# Altium footprint library LAN Transformer.PcbLib: 66 footprints (part 2 of 5)
Each footprint in its own frame and in the unit in brackets; x right, y up, seen from the top. Pads: shape width x height; smd on the part's side, far side on the other; paste and mask are expansions set on the pad; w line width, h text height; cw(c..) or ccw(c..) is an arc to the next point about the centre after c.
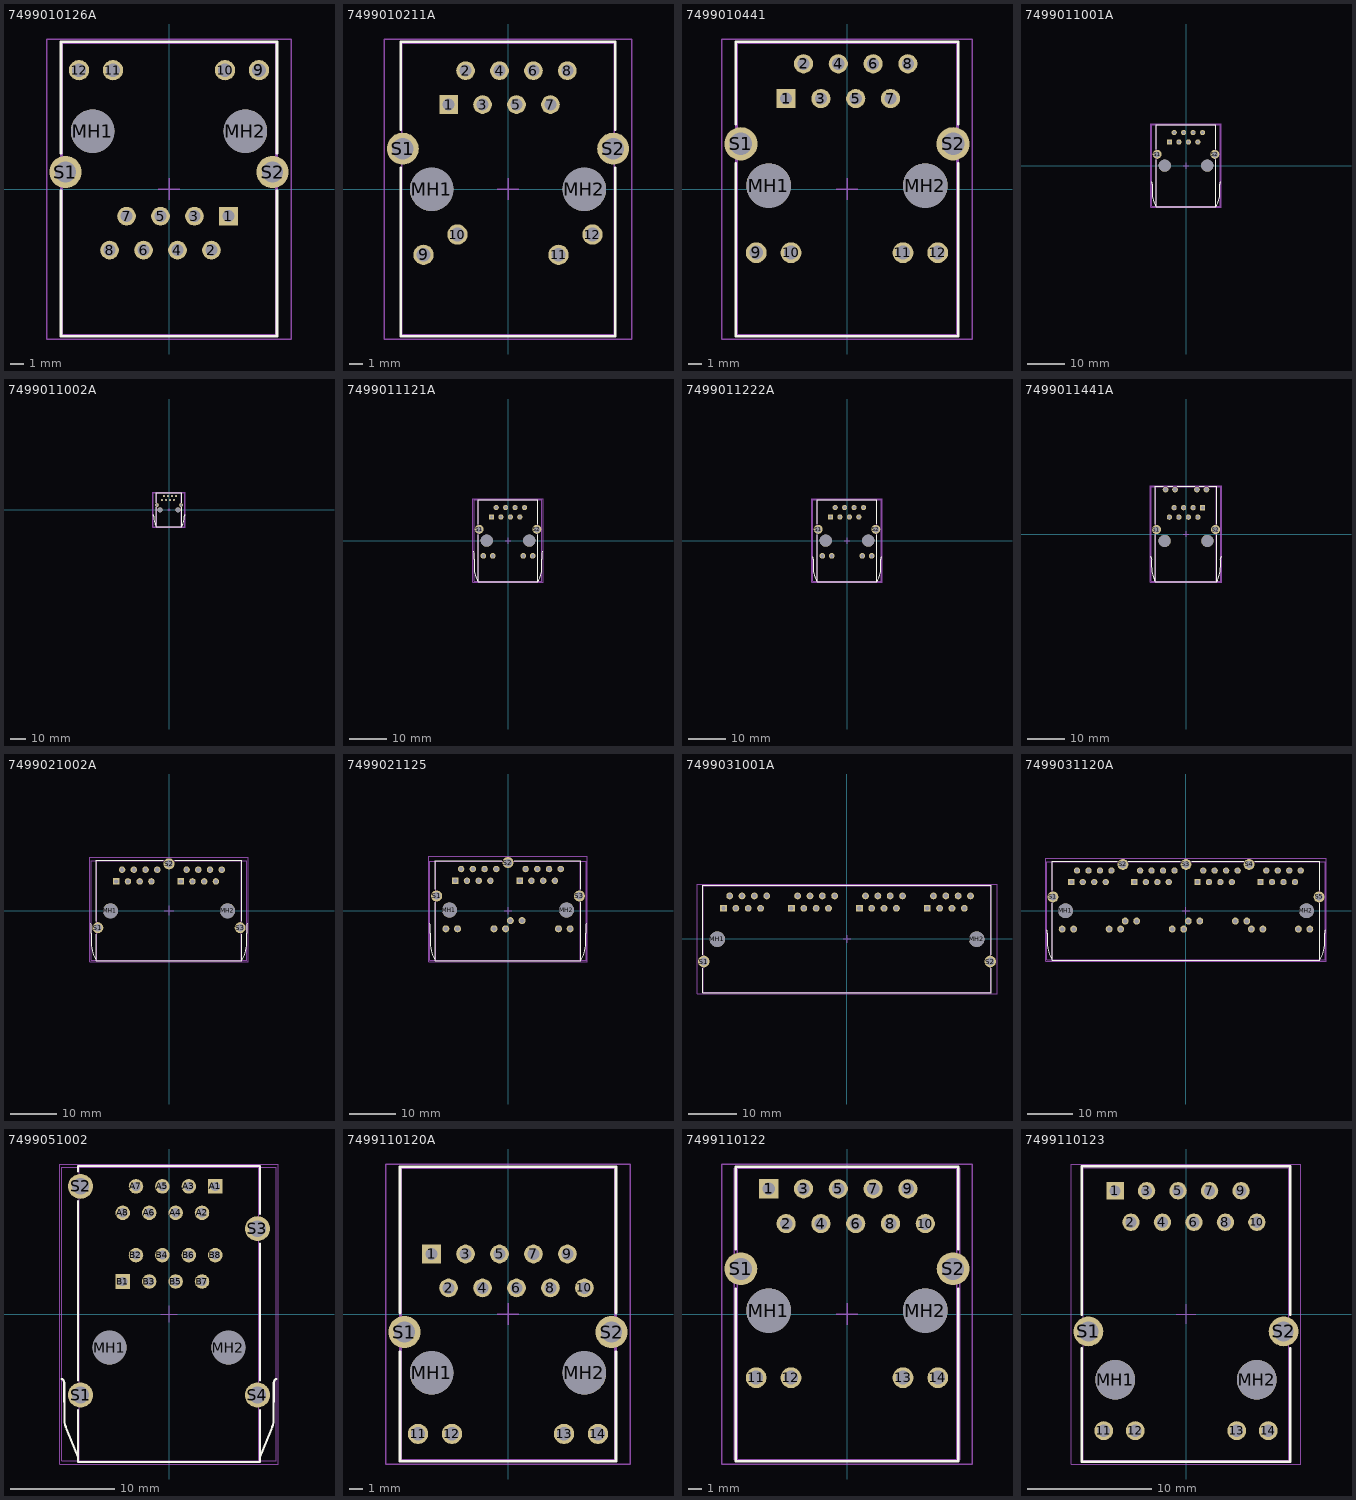
[diagram p1: the footprints below, top view; thin cyan lines are the x and y axes]

## 7499010126A [mm] "LAN Transformer, body 21.84x15.95mm"
height 16.9
pads (16):
  rect 1.4x1.4 hole 0.9: 1(4.445,-2.03)
  round 1.4 hole 0.9: 2(3.175,-4.57) 3(1.905,-2.03) 4(0.635,-4.57) 5(-0.635,-2.03) 6(-1.905,-4.57) 7(-3.175,-2.03) 8(-4.445,-4.57)
  round 1.52 hole 1.02: 9(6.73,8.89) 10(4.19,8.89) 11(-4.19,8.89) 12(-6.73,8.89)
  round 3.25 hole 3.25 unplated: MH1(-5.715,4.32) MH2(5.715,4.32)
  round 2.4 hole 1.6: S1(-7.745,1.27) S2(7.745,1.27)
Top Overlay:
  lines w0.2: -8.075,-0.14 -8.075,-11.02 8.075,-11.02 8.075,-0.14 ; -8.075,2.68 -8.075,11.02 8.075,11.02 8.075,2.68
Mechanical 11:
  lines w0.1: -7.975,-10.92 7.975,-10.92 7.975,10.92 -7.975,10.92 -7.975,-10.92
  text ".Designator" at 0,0 h1
Mechanical 13:
  lines w0.1: -8.1,-10.92 -8.1,10.92 8.1,10.92 8.1,-10.92 -8.1,-10.92
Mechanical 15:
  lines w0.1: -0.8,0 0.8,0 ; 0,-0.8 0,0.8 ; -9.145,-11.22 -9.145,11.22 9.145,11.22 9.145,-11.22 -9.145,-11.22
3D body "7499010126A.stp": height 16.93, standoff -3.27, extent -8.1,-10.92 8.1,10.92

## 7499010211A [mm] "LAN Transformer, body 21.84x15.88mm"
height 13.5
pads (16):
  rect 1.4x1.4 hole 0.9: 1(-4.445,6.32)
  round 1.4 hole 0.9: 2(-3.175,8.86) 3(-1.905,6.32) 4(-0.635,8.86) 5(0.635,6.32) 6(1.905,8.86) 7(3.175,6.32) 8(4.445,8.86)
  round 1.52 hole 1.02: 9(-6.325,-4.93) 10(-3.785,-3.41) 11(3.785,-4.93) 12(6.325,-3.41)
  round 3.25 hole 3.25 unplated: MH1(-5.715,-0.03) MH2(5.715,-0.03)
  round 2.4 hole 1.6: S1(-7.875,3.02) S2(7.875,3.02)
Top Overlay:
  lines w0.2: -8.04,1.6 -8.04,-11.03 8.04,-11.03 8.04,1.6 ; -8.04,4.44 -8.04,11.03 8.04,11.03 8.04,4.44
Mechanical 11:
  lines w0.1: -7.94,-10.92 7.94,-10.92 7.94,10.92 -7.94,10.92 -7.94,-10.92
  text ".Designator" at 0,0 h1
Mechanical 13:
  lines w0.1: -7.94,-10.92 -7.94,10.92 7.94,10.92 7.94,-10.92 -7.94,-10.92
Mechanical 15:
  lines w0.1: -0.8,0 0.8,0 ; 0,-0.8 0,0.8 ; -9.275,-11.23 -9.275,11.23 9.275,11.23 9.275,-11.23 -9.275,-11.23
3D body "7499010211A.stp": height 13.55, standoff -3, extent -7.94,-10.92 7.94,10.92

## 7499010441 [mm] "LAN Transformer, body 21.3x16.04mm"
height 13.5
pads (16):
  rect 1.4x1.4 hole 0.89: 1(-4.445,6.6)
  round 1.4 hole 0.89: 2(-3.175,9.14) 3(-1.905,6.6) 4(-0.635,9.14) 5(0.635,6.6) 6(1.905,9.14) 7(3.175,6.6) 8(4.445,9.14)
  round 1.52 hole 1.02: 9(-6.625,-4.65) 10(-4.085,-4.65) 11(4.085,-4.65) 12(6.625,-4.65)
  round 3.25 hole 3.25 unplated: MH1(-5.715,0.25) MH2(5.715,0.25)
  round 2.43 hole 1.63: S1(-7.745,3.3) S2(7.745,3.3)
Top Overlay:
  lines w0.2: -8.12,1.87 -8.12,-10.75 8.12,-10.75 8.12,1.87 ; -8.12,4.73 -8.12,10.75 8.12,10.75 8.12,4.73
Mechanical 11:
  lines w0.1: -8.02,-10.65 -8.02,10.65 8.02,10.65 8.02,-10.65 -8.02,-10.65
  text ".Designator" at 0,0 h1
Mechanical 13:
  lines w0.1: -8.12,-10.65 8.12,-10.65 8.12,10.65 -8.12,10.65 -8.12,-10.65
Mechanical 15:
  lines w0.1: -0.8,0 0.8,0 ; 0,-0.8 0,0.8 ; -9.16,-10.95 9.16,-10.95 9.16,10.95 -9.16,10.95 -9.16,-10.95
3D body "7499010441.stp": height 13.65, standoff -3.7, extent -8.12,-10.65 8.12,10.65

## 7499011001A [mm] "LAN Transformer, body 21.84x15.88mm"
height 13.95
pads (12):
  rect 1.4x1.4 hole 0.9: 1(-4.445,6.32)
  round 1.4 hole 0.9: 2(-3.175,8.86) 3(-1.905,6.32) 4(-0.635,8.86) 5(0.635,6.32) 6(1.905,8.86) 7(3.175,6.32) 8(4.445,8.86)
  round 3.25 hole 3.25 unplated: MH1(-5.715,-0.03) MH2(5.715,-0.03)
  round 2.4 hole 1.6: S1(-7.745,3.02) S2(7.745,3.02)
Top Overlay:
  lines w0.2: -9.209,-4.323 cw(c-10.32,-4.935) -9.053,-4.992 ccw(c-5.438,-5.432) -9.08,-5.462 ccw(c15.584,-6.29) -9.009,-8.334 ccw(c-0.59,-6.815) -8.04,-11.02 ; -8.04,1.6 -8.04,-11.02 ; -8.04,4.44 -8.04,11.02 8.04,11.02 8.04,4.44 ; 8.04,1.6 8.04,-11.02 ; 9.209,-4.323 ccw(c10.32,-4.935) 9.053,-4.992 cw(c5.438,-5.432) 9.08,-5.462 cw(c-15.584,-6.29) 9.009,-8.334 cw(c0.59,-6.815) 8.04,-11.02 ; -8.04,-11.02 8.04,-11.02
Mechanical 11:
  lines w0.1: -7.94,-10.92 7.94,-10.92 7.94,10.92 -7.94,10.92 -7.94,-10.92
  text ".Designator" at 0,0 h1
Mechanical 13:
  lines w0.1: -9.163,-10.92 -9.163,10.92 9.163,10.92 9.163,-10.92 -9.163,-10.92
Mechanical 15:
  lines w0.1: -0.8,0 0.8,0 ; 0,-0.8 0,0.8 ; -9.4,-11.22 -9.4,11.22 9.4,11.22 9.4,-11.22 -9.4,-11.22
3D body "7499011001A.stp": height 15.17, standoff -3.71, extent -9.163,-10.92 9.163,10.92

## 7499011002A [mm] "LAN Transformer, body 21.84x15.88mm"
height 13.74
pads (12):
  rect 1.4x1.4 hole 0.9: 1(-4.445,6.32)
  round 1.4 hole 0.9: 2(-3.175,8.86) 3(-1.905,6.32) 4(-0.635,8.86) 5(0.635,6.32) 6(1.905,8.86) 7(3.175,6.32) 8(4.445,8.86)
  round 3.25 hole 3.25 unplated: MH1(-5.715,-0.03) MH2(5.715,-0.03)
  round 2.4 hole 1.6: S1(-7.745,3.02) S2(7.745,3.02)
Top Overlay:
  lines w0.2: -10.107,-3.368 cw(c-10.465,-3.994) -9.751,-4.096 ccw(c2.96,-5.12) -9.709,-6.573 ccw(c4.524,-3.711) -8.849,-9.362 cw(c-48.855,-34.82) -8.251,-10.328 cw(c-9.438,-11.219) -8.04,-10.72 ; -8.04,1.6 -8.04,-11.02 8.04,-11.02 8.04,1.6 ; -8.04,4.44 -8.04,11.02 8.04,11.02 8.04,4.44 ; 8.04,-10.72 cw(c9.438,-11.219) 8.251,-10.328 cw(c48.855,-34.82) 8.849,-9.362 ccw(c-4.524,-3.711) 9.709,-6.573 ccw(c-2.96,-5.12) 9.751,-4.096 cw(c10.465,-3.994) 10.107,-3.368
Mechanical 11:
  lines w0.1: -7.94,-10.92 7.94,-10.92 7.94,10.92 -7.94,10.92 -7.94,-10.92
  text ".Designator" at 0,0 h1
Mechanical 13:
  lines w0.1: -10.14,-10.92 -10.14,10.92 10.14,10.92 10.14,-10.92 -10.14,-10.92
Mechanical 15:
  lines w0.1: -0.8,0 0.8,0 ; 0,-0.8 0,0.8 ; 10.3,-9.38 10.3,-11.22 ; 10.3,-11.22 10.3,11.22 -10.3,11.22 -10.3,-11.22 10.3,-11.22
3D body "7499011002A.stp": height 16.04, standoff -3.33, extent -10.14,-10.92 10.14,10.92

## 7499011121A [mm] "LAN Transformer, body 21.84x15.88mm"
height 13.74
pads (16):
  rect 1.4x1.4 hole 0.9: 1(-4.445,6.32)
  round 1.4 hole 0.9: 2(-3.175,8.86) 3(-1.905,6.32) 4(-0.635,8.86) 5(0.635,6.32) 6(1.905,8.86) 7(3.175,6.32) 8(4.445,8.86)
  round 1.52 hole 1.02: 9(-6.63,-4.11) 10(-4.09,-4.11) 11(4.09,-4.11) 12(6.63,-4.11)
  round 3.25 hole 3.25 unplated: MH1(-5.715,-0.03) MH2(5.715,-0.03)
  round 2.4 hole 1.6: S1(-7.745,3.02) S2(7.745,3.02)
Top Overlay:
  lines w0.2: -9.202,-2.911 cw(c-10.313,-3.523) -9.046,-3.58 -9.053,-4.992 ccw(c-5.438,-5.432) -9.08,-5.462 ccw(c15.584,-6.29) -9.009,-8.334 ccw(c-0.59,-6.815) -8.04,-11.02 ; -8.04,1.61 -8.04,-11.02 ; -8.04,4.43 -8.04,11.02 8.04,11.02 8.04,4.43 ; 8.04,1.61 8.04,-11.02 ; 9.202,-2.911 ccw(c10.313,-3.523) 9.046,-3.58 9.053,-4.992 cw(c5.438,-5.432) 9.08,-5.462 cw(c-15.584,-6.29) 9.009,-8.334 cw(c0.59,-6.815) 8.04,-11.02 ; -8.04,-11.02 8.04,-11.02
Mechanical 11:
  lines w0.1: -7.94,-10.92 7.94,-10.92 7.94,10.92 -7.94,10.92 -7.94,-10.92
  text ".Designator" at 0,0 h1
Mechanical 13:
  lines w0.1: -9.111,-10.92 -9.111,10.92 9.111,10.92 9.111,-10.92 -9.111,-10.92
Mechanical 15:
  lines w0.1: -0.8,0 0.8,0 ; 0,-0.8 0,0.8 ; -9.4,-11.22 9.4,-11.22 9.4,11.22 -9.4,11.22 -9.4,-11.22
3D body "7499011121A.stp": height 15.4, standoff -3.44, extent -9.111,-10.92 9.111,10.92

## 7499011222A [mm] "LAN Transformer, body 21.6x16mm"
height 13.95
pads (16):
  rect 1.4x1.4 hole 0.9: 1(-4.445,6.32)
  round 1.4 hole 0.9: 2(-3.175,8.86) 3(-1.905,6.32) 4(-0.635,8.86) 5(0.635,6.32) 6(1.905,8.86) 7(3.175,6.32) 8(4.445,8.86)
  round 1.52 hole 1.02: 9(-6.63,-4.11) 10(-4.09,-4.11) 11(4.09,-4.11) 12(6.63,-4.11)
  round 3.25 hole 3.25 unplated: MH1(-5.715,-0.03) MH2(5.715,-0.03)
  round 2.43 hole 1.63: S1(-7.745,3.02) S2(7.745,3.02)
Top Overlay:
  lines w0.2: -9.209,-4.323 cw(c-10.32,-4.935) -9.053,-4.992 ccw(c-5.438,-5.432) -9.08,-5.462 ccw(c15.584,-6.29) -9.009,-8.334 ccw(c-0.59,-6.815) -8.04,-11.02 ; -8.04,1.6 -8.04,-11.02 ; -8.04,4.45 -8.04,11.02 8.04,11.02 8.04,4.45 ; 8.04,1.6 8.04,-11.02 ; 9.209,-4.323 ccw(c10.32,-4.935) 9.053,-4.992 cw(c5.438,-5.432) 9.08,-5.462 cw(c-15.584,-6.29) 9.009,-8.334 cw(c0.59,-6.815) 8.04,-11.02 ; -8.04,-11.02 8.04,-11.02
Mechanical 11:
  lines w0.1: -7.94,-10.92 -7.94,10.92 7.94,10.92 7.94,-10.92 -7.94,-10.92
  text ".Designator" at 0,0 h1
Mechanical 13:
  lines w0.1: -9.223,-10.92 9.223,-10.92 9.223,10.92 -9.223,10.92 -9.223,-10.92
Mechanical 15:
  lines w0.1: -0.8,0 0.8,0 ; 0,-0.8 0,0.8 ; -9.423,-11.22 9.423,-11.22 9.423,11.22 -9.423,11.22 -9.423,-11.22
3D body "7499011222A.stp": height 15.17, standoff -4.06, extent -9.223,-10.92 9.223,10.68

## 7499011441A [mm] "LAN Transformer, body 25.3x16.2mm"
height 13.5
pads (16):
  rect 1.4x1.4 hole 0.9: 1(4.445,7.04)
  round 1.4 hole 0.9: 2(3.175,4.5) 3(1.905,7.04) 4(0.635,4.5) 5(-0.635,7.04) 6(-1.905,4.5) 7(-3.175,7.04) 8(-4.445,4.5)
  round 1.52 hole 1.02: 9(5.465,11.87) 10(2.925,11.87) 11(-2.925,11.87) 12(-5.465,11.87)
  round 3.25 hole 3.25 unplated: MH1(-5.715,-1.85) MH2(5.715,-1.85)
  round 2.4 hole 1.6: S1(-7.9,1.2) S2(7.9,1.2)
Top Overlay:
  lines w0.2: -9.369,-6.053 cw(c-10.48,-6.665) -9.213,-6.722 ccw(c-5.598,-7.162) -9.24,-7.192 ccw(c15.424,-8.02) -9.169,-10.064 ccw(c-0.75,-8.545) -8.2,-12.75 ; -8.2,-0.22 -8.2,-12.75 ; -8.2,2.61 -8.2,12.75 -6.07,12.75 ; -4.85,12.75 -3.53,12.75 ; -2.31,12.75 2.32,12.75 ; 3.53,12.75 4.85,12.75 ; 6.07,12.75 8.2,12.75 8.2,2.61 ; 8.2,-0.22 8.2,-12.75 ; 9.369,-6.053 ccw(c10.48,-6.665) 9.213,-6.722 cw(c5.598,-7.162) 9.24,-7.192 cw(c-15.424,-8.02) 9.169,-10.064 cw(c0.75,-8.545) 8.2,-12.75 ; -8.2,-12.75 8.2,-12.75
Mechanical 11:
  lines w0.1: -8.1,-12.65 8.1,-12.65 8.1,12.65 -8.1,12.65 -8.1,-12.65
  text ".Designator" at 0,0 h1
Mechanical 13:
  lines w0.1: -9.323,-12.65 -9.323,12.65 9.323,12.65 9.323,-12.65 -9.323,-12.65
Mechanical 15:
  lines w0.1: -0.8,0 0.8,0 ; 0,-0.8 0,0.8 ; -9.6,-12.95 9.6,-12.95 9.6,12.95 -9.6,12.95 -9.6,-12.95
3D body "7499011441A.stp": height 14.78, standoff -3.5, extent -9.323,-12.65 9.323,12.65

## 7499021002A [mm] "LAN Transformer, body 31.4x21.59mm"
height 15.21
pads (21):
  rect 1.4x1.4 hole 0.9: A1(-11.43,6.305) B1(2.54,6.305)
  round 1.4 hole 0.9: A2(-10.16,8.845) A3(-8.89,6.305) A4(-7.62,8.845) A5(-6.35,6.305) A6(-5.08,8.845) A7(-3.81,6.305) A8(-2.54,8.845) B2(3.81,8.845) B3(5.08,6.305) B4(6.35,8.845) B5(7.62,6.305) B6(8.89,8.845) B7(10.16,6.305) B8(11.43,8.845)
  round 3.25 hole 3.25 unplated: MH1(-12.7,-0.045) MH2(12.7,-0.045)
  round 2.4 hole 1.6: S1(-15.43,-3.725) S2(0,10.115) S3(15.43,-3.725)
Top Overlay:
  lines w0.2: -16.962,-2.786 cw(c-18.073,-3.398) -16.806,-3.455 -16.813,-4.867 ccw(c-13.198,-5.307) -16.84,-5.337 ccw(c7.824,-6.165) -16.769,-8.209 ccw(c-8.35,-6.69) -15.8,-10.895 ; -15.8,-5.125 -15.8,-10.895 ; -15.8,-2.325 -15.8,10.895 -1.26,10.895 ; 1.26,10.895 15.8,10.895 15.8,-2.325 ; 15.8,-5.125 15.8,-10.895 ; 16.962,-2.786 ccw(c18.073,-3.398) 16.806,-3.455 16.813,-4.867 cw(c13.198,-5.307) 16.84,-5.337 cw(c-7.824,-6.165) 16.769,-8.209 cw(c8.35,-6.69) 15.8,-10.895 ; -15.8,-10.895 15.8,-10.895
Mechanical 11:
  lines w0.1: -15.7,-10.795 -15.7,10.795 15.7,10.795 15.7,-10.795 -15.7,-10.795
  text ".Designator" at 0,0 h1
Mechanical 13:
  lines w0.1: -16.798,-10.795 16.798,-10.795 16.798,10.795 -16.798,10.795 -16.798,-10.795
Mechanical 15:
  lines w0.1: -1,0 1,0 ; 0,-1 0,1 ; -17.16,-11.095 -17.16,11.515 17.16,11.515 17.16,-11.095 -17.16,-11.095
3D body "7499021002A.stp": height 15.48, standoff -4.66, extent -16.799,-10.795 16.798,10.795

## 7499021125 [mm] "LAN Transformer, body 31.4x21.5mm"
height 15.21
pads (29):
  rect 1.4x1.4 hole 0.89: A1(-11.43,6.5) B1(2.54,6.5)
  round 1.4 hole 0.89: A2(-10.16,9.04) A3(-8.89,6.5) A4(-7.62,9.04) A5(-6.35,6.5) A6(-5.08,9.04) A7(-3.81,6.5) A8(-2.54,9.04) B2(3.81,9.04) B3(5.08,6.5) B4(6.35,9.04) B5(7.62,6.5) B6(8.89,9.04) B7(10.16,6.5) B8(11.43,9.04)
  round 1.52 hole 1.02: A9(-13.47,-3.91) A10(-10.93,-3.91) A11(-3.05,-3.91) A12(-0.51,-3.91) B9(0.51,-2.14) B10(3.05,-2.14) B11(10.93,-3.91) B12(13.47,-3.91)
  round 3.25 hole 3.25 unplated: MH1(-12.7,0.15) MH2(12.7,0.15)
  round 2.4 hole 1.63: S1(-15.465,3.2) S2(0,10.44) S3(15.465,3.2)
Top Overlay:
  lines w0.2: -16.962,-2.741 cw(c-18.073,-3.353) -16.806,-3.41 -16.813,-4.822 ccw(c-13.198,-5.262) -16.84,-5.292 ccw(c7.824,-6.12) -16.769,-8.164 ccw(c-8.35,-6.645) -15.8,-10.85 ; -15.8,1.79 -15.8,-10.85 ; -15.8,4.61 -15.8,10.85 -1.39,10.85 ; 1.39,10.85 15.8,10.85 15.8,4.61 ; 15.8,1.79 15.8,-10.85 ; 16.962,-2.741 ccw(c18.073,-3.353) 16.806,-3.41 16.813,-4.822 cw(c13.198,-5.262) 16.84,-5.292 cw(c-7.824,-6.12) 16.769,-8.164 cw(c8.35,-6.645) 15.8,-10.85 ; -15.8,-10.85 15.8,-10.85
Mechanical 11:
  lines w0.1: -15.7,-10.75 -15.7,10.75 15.7,10.75 15.7,-10.75 -15.7,-10.75
  text ".Designator" at 0,0 h1
Mechanical 13:
  lines w0.1: -16.923,-10.75 16.923,-10.75 16.923,10.75 -16.923,10.75 -16.923,-10.75
Mechanical 15:
  lines w0.1: -0.8,0 0.8,0 ; 0,-0.8 0,0.8 ; -17.2,-11.05 -17.2,11.84 17.2,11.84 17.2,-11.05 -17.2,-11.05
3D body "7499021125.stp": height 14.81, standoff -3.66, extent -16.923,-10.75 16.923,10.75

## 7499031001A [mm] "LAN Transformer, body 59.3x21.84mm"
height 13.5
pads (36):
  rect 1.4x1.4 hole 0.9: A1(-25.4,6.32) B1(-11.43,6.32) C1(2.54,6.32) D1(16.51,6.32)
  round 1.4 hole 0.9: A2(-24.13,8.86) A3(-22.86,6.32) A4(-21.59,8.86) A5(-20.32,6.32) A6(-19.05,8.86) A7(-17.78,6.32) A8(-16.51,8.86) B2(-10.16,8.86) B3(-8.89,6.32) B4(-7.62,8.86) B5(-6.35,6.32) B6(-5.08,8.86) B7(-3.81,6.32) B8(-2.54,8.86) C2(3.81,8.86) C3(5.08,6.32) C4(6.35,8.86) C5(7.62,6.32) C6(8.89,8.86) C7(10.16,6.32) C8(11.43,8.86) D2(17.78,8.86) D3(19.05,6.32) D4(20.32,8.86) D5(21.59,6.32) D6(22.86,8.86) D7(24.13,6.32) D8(25.4,8.86)
  round 3.2 hole 3.2 unplated: MH1(-26.67,-0.03) MH2(26.67,-0.03)
  round 2.4 hole 1.57: S1(-29.455,-4.63) S2(29.455,-4.63)
Top Overlay:
  lines w0.2: -29.665,-6.05 -29.665,-11.02 29.665,-11.02 29.665,-6.05 ; -29.665,-3.21 -29.665,11.02 29.665,11.02 29.665,-3.21
Mechanical 11:
  lines w0.1: -29.565,10.89 -29.565,-10.92 29.565,-10.92 29.565,10.92 -29.565,10.92
  text ".Designator" at 0,0 h1
Mechanical 13:
  lines w0.1: -29.565,10.89 -29.565,-10.92 29.565,-10.92 29.565,10.92 -29.565,10.92
Mechanical 15:
  lines w0.1: -0.8,0 0.8,0 ; 0,-0.8 0,0.8 ; -30.855,-11.22 30.855,-11.22 30.855,11.22 -30.855,11.22 -30.855,-11.22
3D body "7499031001A.stp": height 13.56, standoff -3.64, extent -29.565,-10.95 29.565,10.89

## 7499031120A [mm] "LAN Transformer, body 59.13x21.8mm"
height 13.5
pads (55):
  rect 1.4x1.4 hole 0.89: A1(-25.4,6.35) B1(-11.43,6.35) C1(2.54,6.35) D1(16.51,6.35)
  round 1.4 hole 0.89: A2(-24.13,8.89) A3(-22.86,6.35) A4(-21.59,8.89) A5(-20.32,6.35) A6(-19.05,8.89) A7(-17.78,6.35) A8(-16.51,8.89) B2(-10.16,8.89) B3(-8.89,6.35) B4(-7.62,8.89) B5(-6.35,6.35) B6(-5.08,8.89) B7(-3.81,6.35) B8(-2.54,8.89) C2(3.81,8.89) C3(5.08,6.35) C4(6.35,8.89) C5(7.62,6.35) C6(8.89,8.89) C7(10.16,6.35) C8(11.43,8.89) D2(17.78,8.89) D3(19.05,6.35) D4(20.32,8.89) D5(21.59,6.35) D6(22.86,8.89) D7(24.13,6.35) D8(25.4,8.89)
  round 1.52 hole 1.02: A9(-27.42,-4.06) A10(-24.88,-4.06) A11(-17.02,-4.06) A12(-14.48,-4.06) B9(-13.46,-2.29) B10(-10.92,-2.29) B11(-3.05,-4.06) B12(-0.51,-4.06) C9(0.51,-2.29) C10(3.05,-2.29) C11(10.92,-2.29) C12(13.46,-2.29) D9(14.48,-4.06) D10(17.02,-4.06) D11(24.88,-4.06) D12(27.42,-4.06)
  round 3.25 hole 3.25 unplated: MH1(-26.67,0) MH2(26.67,0)
  round 2.4 hole 1.63: S1(-29.455,3.05) S2(-13.97,10.24) S3(0,10.24) S4(13.97,10.24) S5(29.455,3.05)
Top Overlay:
  lines w0.2: -30.834,-4.293 cw(c-31.945,-4.905) -30.678,-4.962 ccw(c-27.063,-5.402) -30.705,-5.432 ccw(c-6.041,-6.26) -30.634,-8.304 ccw(c-22.215,-6.785) -29.665,-10.99 ; -29.665,1.63 -29.665,-11 29.665,-11 29.665,1.63 ; -29.665,4.48 -29.665,11 -15.205,11 ; -12.745,11 -1.235,11 ; 1.225,11 12.735,11 ; 15.205,11 29.665,11 29.665,4.48 ; 29.665,-10.99 ccw(c22.215,-6.785) 30.634,-8.304 ccw(c6.041,-6.26) 30.705,-5.432 ccw(c27.063,-5.402) 30.678,-4.962 cw(c31.945,-4.905) 30.834,-4.293
Mechanical 11:
  lines w0.1: -29.565,-10.9 29.565,-10.9 29.565,10.9 -29.565,10.9 -29.565,-10.9
  text ".Designator" at 0,0 h1
Mechanical 13:
  lines w0.1: -30.788,-10.9 -30.788,10.9 30.788,10.9 30.788,-10.9 -30.788,-10.9
Mechanical 15:
  lines w0.1: -0.8,0 0.8,0 ; 0,-0.8 0,0.8 ; -31.034,-11.2 -31.034,11.64 31.034,11.64 31.034,-11.2 -31.034,-11.2
3D body "7499031120A.stp": height 14.78, standoff -3.64, extent -30.788,-10.9 30.788,10.9

## 7499051002 [mm] "LAN Transformer, body 28.25x17.27mm"
height 25.2
pads (22):
  rect 1.4x1.4 hole 0.89: A1(4.445,12.265) B1(-4.445,3.125)
  round 1.4 hole 0.89: A2(3.175,9.725) A3(1.905,12.265) A4(0.635,9.725) A5(-0.635,12.265) A6(-1.905,9.725) A7(-3.175,12.265) A8(-4.445,9.725) B2(-3.175,5.665) B3(-1.905,3.125) B4(-0.635,5.665) B5(0.635,3.125) B6(1.905,5.665) B7(3.175,3.125) B8(4.445,5.665)
  round 3.25 hole 3.25 unplated: MH1(-5.715,-3.225) MH2(5.715,-3.225)
  round 2.4 hole 1.6: S1(-8.51,-7.795) S2(-8.51,12.275) S3(8.51,8.205) S4(8.51,-7.795)
Top Overlay:
  lines w0.2: -10.318,-6.234 cw(c-10.555,-6.655) -10.072,-6.655 ; -10.075,-6.605 -10.033,-10.42 ; -10.04,-10.421 ccw(c-7.412,-9.999) -9.743,-11.284 -8.739,-13.767 ; -8.735,-9.215 -8.735,-14.225 8.735,-14.225 8.735,-9.215 ; -8.735,-6.375 -8.735,10.855 ; -8.735,13.705 -8.735,14.225 8.735,14.225 8.735,9.625 ; 8.735,-6.375 8.735,6.785 ; 8.739,-13.767 9.743,-11.284 ccw(c7.412,-9.999) 10.04,-10.421 ; 10.033,-10.42 10.075,-6.605 ; 10.072,-6.655 cw(c10.555,-6.655) 10.318,-6.234
Mechanical 11:
  lines w0.1: -8.635,-14.125 -8.635,14.125 8.635,14.125 8.635,-14.125 -8.635,-14.125
  text ".Designator" at 0,0 h1
Mechanical 13:
  lines w0.1: -10.306,-14.125 10.306,-14.125 10.306,14.125 -10.306,14.125 -10.306,-14.125
Mechanical 15:
  lines w0.1: -0.8,0 0.8,0 ; 0,-0.8 0,0.8 ; -10.519,-14.425 -10.519,14.425 10.519,14.425 10.519,-14.425 -10.519,-14.425
3D body "7499051002.stp": height 26.87, standoff -3.75, extent -10.306,-14.125 10.306,14.125

## 7499110120A [mm] "LAN Transformer, body 21.84x15.95mm"
height 16.9
pads (18):
  rect 1.4x1.4 hole 0.9: 1(-5.715,4.49)
  round 1.4 hole 0.9: 2(-4.445,1.95) 3(-3.175,4.49) 4(-1.905,1.95) 5(-0.635,4.49) 6(0.635,1.95) 7(1.905,4.49) 8(3.175,1.95) 9(4.445,4.49) 10(5.715,1.95)
  round 1.52 hole 1.02: 11(-6.73,-8.97) 12(-4.19,-8.97) 13(4.19,-8.97) 14(6.73,-8.97)
  round 3.25 hole 3.25 unplated: MH1(-5.715,-4.4) MH2(5.715,-4.4)
  round 2.4 hole 1.6: S1(-7.745,-1.35) S2(7.745,-1.35)
Top Overlay:
  lines w0.2: -8.075,-2.82 -8.075,-11.02 8.075,-11.02 8.075,-2.82 ; -8.075,0.08 -8.075,11.02 8.075,11.02 8.075,0.08
Mechanical 11:
  lines w0.1: -7.975,-10.92 7.975,-10.92 7.975,10.92 -7.975,10.92 -7.975,-10.92
  text ".Designator" at 0,0 h1
Mechanical 13:
  lines w0.1: -8.1,-10.92 -8.1,10.92 8.1,10.92 8.1,-10.92 -8.1,-10.92
Mechanical 15:
  lines w0.1: -0.8,0 0.8,0 ; 0,-0.8 0,0.8 ; -9.145,-11.22 -9.145,11.22 9.145,11.22 9.145,-11.22 -9.145,-11.22
3D body "7499110120A.stp": height 16.87, standoff -3.32, extent -8.1,-10.92 8.1,10.92

## 7499110122 [mm] "LAN Transformer, body 21.3x16.04mm"
height 13.5
pads (18):
  rect 1.4x1.4 hole 0.9: 1(-5.715,9.14)
  round 1.4 hole 0.9: 2(-4.445,6.6) 3(-3.175,9.14) 4(-1.905,6.6) 5(-0.635,9.14) 6(0.635,6.6) 7(1.905,9.14) 8(3.175,6.6) 9(4.445,9.14) 10(5.715,6.6)
  round 1.52 hole 1.02: 11(-6.63,-4.65) 12(-4.09,-4.65) 13(4.09,-4.65) 14(6.63,-4.65)
  round 3.25 hole 3.25 unplated: MH1(-5.715,0.25) MH2(5.715,0.25)
  round 2.4 hole 1.6: S1(-7.745,3.3) S2(7.745,3.3)
Top Overlay:
  lines w0.2: -8.12,1.85 -8.12,-10.75 8.12,-10.75 8.12,1.85 ; -8.12,4.75 -8.12,10.75 8.12,10.75 8.12,4.75
Mechanical 11:
  lines w0.1: -8.02,-10.65 -8.02,10.65 8.02,10.65 8.02,-10.65 -8.02,-10.65
  text ".Designator" at 0,0 h1
Mechanical 13:
  lines w0.1: -8.22,-10.65 8.22,-10.65 8.22,10.65 -8.22,10.65 -8.22,-10.65
Mechanical 15:
  lines w0.1: -0.8,0 0.8,0 ; 0,-0.8 0,0.8 ; -9.145,-10.95 -9.145,10.95 9.145,10.95 9.145,-10.95 -9.145,-10.95
3D body "7499110122.stp": height 13.7, standoff -3.65, extent -8.22,-10.65 8.22,10.65

## 7499110123 [mm] "LAN Transformer, body 23.6x16.6mm"
height 17.1
pads (18):
  rect 1.4x1.4 hole 0.89: 1(-5.715,9.94)
  round 1.4 hole 0.89: 2(-4.445,7.4) 3(-3.175,9.94) 4(-1.905,7.4) 5(-0.635,9.94) 6(0.635,7.4) 7(1.905,9.94) 8(3.175,7.4) 9(4.445,9.94) 10(5.715,7.4)
  round 1.52 hole 1.02: 11(-6.635,-9.41) 12(-4.095,-9.41) 13(4.095,-9.41) 14(6.635,-9.41)
  round 3.2 hole 3.2 unplated: MH1(-5.715,-5.3) MH2(5.715,-5.3)
  round 2.4 hole 1.63: S1(-7.875,-1.41) S2(7.875,-1.41)
Top Overlay:
  lines w0.2: -8.4,-2.77 -8.4,-11.9 8.4,-11.9 8.4,-2.77 ; -8.4,-0.05 -8.4,11.9 8.4,11.9 8.4,-0.05
Mechanical 11:
  lines w0.1: -8.3,-11.8 8.3,-11.8 8.3,11.8 -8.3,11.8 -8.3,-11.8
  text ".Designator" at 0,0 h1
Mechanical 13:
  lines w0.1: -8.3,-11.8 -8.3,11.8 8.3,11.8 8.3,-11.8 -8.3,-11.8
Mechanical 15:
  lines w0.1: -0.8,0 0.8,0 ; 0,-0.8 0,0.8 ; -9.275,-12.1 -9.275,12.1 9.275,12.1 9.275,-12.1 -9.275,-12.1
3D body "7499110123.stp": height 17.2, standoff -2.7, extent -8.3,-11.8 8.3,11.8